# Altium footprint library Angler.PcbLib: 331 footprints (part 8 of 21)
Each footprint in its own frame and in the unit in brackets; x right, y up, seen from the top. Pads: shape width x height; smd on the part's side, far side on the other; paste and mask are expansions set on the pad; w line width, h text height; cw(c..) or ccw(c..) is an arc to the next point about the centre after c.
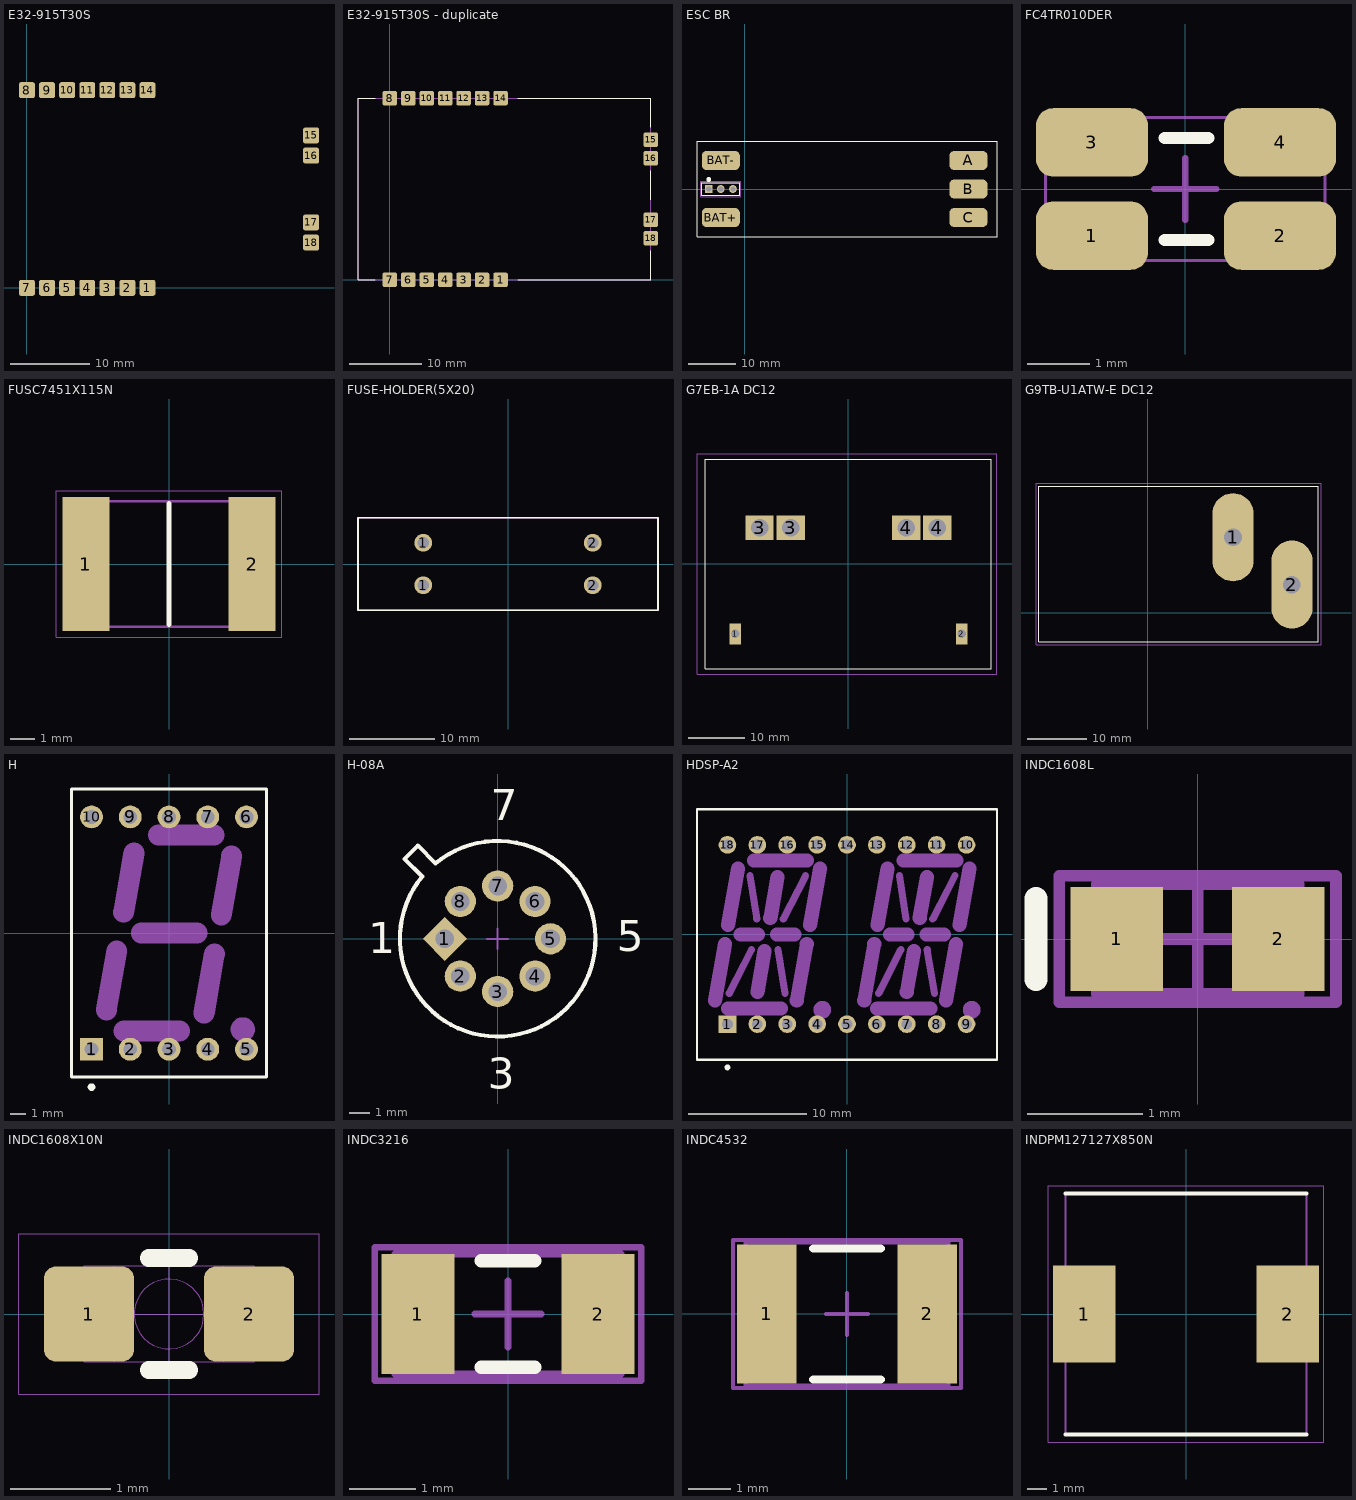
[diagram p7: the footprints below, top view; thin cyan lines are the x and y axes]

## E32-915T30S [mm]
pads (18):
  rrect25% 2x2 smd paste+0 mask+0.064: 1(15.24,0) 2(12.7,0) 3(10.16,0) 4(7.62,0) 5(5.08,0) 6(2.54,0) 7(0,0) 8(0,25) 9(2.54,25) 10(5.08,25) 11(7.62,25) 12(10.16,25) 13(12.7,25) 14(15.24,25) 15(35.92,19.27) 16(35.92,16.73) 17(35.92,8.27) 18(35.92,5.73)

## E32-915T30S - duplicate [mm]
pads (18):
  rrect25% 2x2 smd paste+0 mask+0.064: 1(15.24,0) 2(12.7,0) 3(10.16,0) 4(7.62,0) 5(5.08,0) 6(2.54,0) 7(0,0) 8(0,25) 9(2.54,25) 10(5.08,25) 11(7.62,25) 12(10.16,25) 13(12.7,25) 14(15.24,25) 15(35.92,19.27) 16(35.92,16.73) 17(35.92,8.27) 18(35.92,5.73)
Top Overlay:
  lines w0.152: -2,0 -4.38,0 -4.38,25 -2,25 ; 17.62,0 35.92,0 35.92,4 ; 17.62,25 35.92,25 35.92,21 ; 35.92,11 35.92,15
Mechanical 13:
  lines w0.152: -4.38,0 35.92,0 35.92,25 -4.38,25 -4.38,0

## ESC BR [mm]
pads (8):
  rrect50% 8x4 smd: A(47,6) B(47,0) BAT+(-5,-6) BAT-(-5,6) C(47,-6)
  round 1.65 hole 1.1: GND(-2.46,0) NC(-5,0)
  rect 1.65x1.65 hole 1.1: PWM(-7.54,0)
Top Overlay:
  circle w0.5: c-7.54,2 r0.25
  lines w0.2: -10,-10 53,-10 53,10 -10,10 -10,-10 ; -8.96,-1.345 -8.96,1.345 -1.03,1.345 -1.03,-1.345 -8.96,-1.345
Mechanical 13:
  lines w0.1: -8.96,-1.345 -1.03,-1.345 -1.03,1.345 -8.96,1.345 -8.96,-1.345
Mechanical 15:
  lines w0.05: -9.21,-1.595 -0.79,-1.595 -0.79,1.595 -9.21,1.595 -9.21,-1.595
3D body "Download_STP_61300311121 (rev1).stp": height 8.57, standoff -2.97, extent -8.81,-1.27 -1.19,1.27
3D body "ESC.STEP": height 7.35, standoff 0.07, extent -4.587,-8.6 46.7,8.5

## FC4TR010DER [mm] "1206 WIDE"
height 0.65
pads (4):
  rrect50% 1.8x1.1 smd: 1(-1.5,-0.75) 2(1.525,-0.75) 3(-1.5,0.75) 4(1.525,0.75)
Top Overlay:
  lines w0.2: -0.33,-0.82 0.37,-0.82 ; -0.33,0.82 0.37,0.82
Mechanical 15:
  lines w0.05: -2.25,-1.15 2.25,-1.15 2.25,1.15 -2.25,1.15 -2.25,-1.15
  lines w0.1: -0.5,0 0.5,0 ; 0,-0.5 0,0.5
3D body "RESC3116X06N.step": height 0.65, standoff 0, extent -1.65,-0.875 1.65,0.875

## FUSC7451X115N [mm]
pads (2):
  rect 1.92x5.45 smd: 1(-3.385,0) 2(3.385,0)
Top Overlay:
  lines w0.2: 0,-2.46 0,2.46
Mechanical 13:
  lines w0.1: -3.678,-2.56 -3.678,2.56 3.678,2.56 3.678,-2.56 -3.678,-2.56
Mechanical 15:
  lines w0.05: -4.595,-2.975 -4.595,2.975 4.595,2.975 4.595,-2.975 -4.595,-2.975
3D body "0ZCF0300AF2C.stp": height 1.15, standoff 0, extent -3.678,-2.56 3.678,2.56

## FUSE-HOLDER(5X20) [mm]
pads (4):
  round 2.1 hole 1.4: 1(-10,-2.5) 1(-10,2.5) 2(10,-2.5) 2(10,2.5)
Top Overlay:
  lines w0.2: -17.7,-5.45 17.7,-5.45 17.7,5.45 -17.7,5.45 -17.7,-5.45
Mechanical 13:
  lines w0.2: -17.7,-5.45 -17.7,5.45 17.7,5.45 17.7,-5.45 -17.7,-5.45
3D body "31-8231.stp": height 12.7, standoff -3.13, extent -17.7,-5.45 17.7,5.45
3D body "3AG_MELF.step": height 11.45, standoff 5, extent -16.256,-3.222 16.256,3.222

## G7EB-1A DC12 [mm] "G7EB-1A DC12"
pads (6):
  rect 2x3.7 hole 1.5 square: 1(-20,-12.35) 2(20,-12.35)
  rect 5x4.3 hole 3.1 square: 3(-15.7,6.4) 3(-10.2,6.4) 4(10.2,6.4) 4(15.7,6.4)
Top Overlay:
  lines w0.2: -25.25,-18.5 -25.25,18.5 25.25,18.5 25.25,-18.5 -25.25,-18.5
Mechanical 15:
  lines w0.1: -26.75,-19.5 -26.75,19.5 26.25,19.5 26.25,-19.5 -26.75,-19.5
3D body "g7eb-1a.stp": height 40.5, standoff -4, extent -25.25,-18.5 25.25,18.5

## G9TB-U1ATW-E DC12 [mm] "G9TB-U1ATW-E DC12"
pads (2):
  oval 7x15 hole 3 square: 1(14.5,12.8) 2(24.5,4.75)
Top Overlay:
  lines w0.2: -18.5,-5 -18.5,21.5 29,21.5 29,-5 -18.5,-5
Mechanical 15:
  lines w0.1: -19,-5.5 -19,22 29.5,22 29.5,-5.5 -19,-5.5
3D body "G9TB_U1ATW_E.step": height 38.2, standoff -11.5, extent -20.55,-3 27.15,19.5

## H [mm] "LED, 7-Segment Display, 14.2 mm, RHD; 10 Leads; Row Space 15.24 mm; Pitch 2.54 mm"
height 8.25
pads (10):
  rect 1.5x1.5 hole 0.9: 1(-5.08,-7.62)
  round 1.5 hole 0.9: 2(-2.54,-7.62) 3(0,-7.62) 4(2.54,-7.62) 5(5.08,-7.62) 6(5.08,7.62) 7(2.54,7.62) 8(0,7.62) 9(-2.54,7.62) 10(-5.08,7.62)
Top Overlay:
  circle w0.25: c-5.08,-10.1 r0.125
  lines w0.2: -6.4,-9.45 -6.4,9.45 6.4,9.45 6.4,-9.45 -6.4,-9.45
Mechanical 1:
  circle w1: c4.842,-6.316 r0.296
  lines w1.37: -4.108,-5.054 -3.425,-1.17 ; -2.974,1.368 -2.293,5.255 ; -2.958,-6.429 0.692,-6.426 ; -1.821,0 1.828,0 ; -0.689,6.425 2.96,6.425 ; 2.295,-5.256 2.98,-1.371 ; 3.427,1.169 4.11,5.058
Mechanical 13:
  lines w0.1: -6.4,-9.45 6.4,-9.45 6.4,9.45 -6.4,9.45 -6.4,-9.45
3D body: height 8.25, standoff 0, extent -6.4,-9.45 6.4,9.45

## H-08A [mm] "Can; 8 Leads; Pin Circle Dia. 5.08 mm; Lead Dia. 0.53 mm (max)"
height 4.7
pads (8):
  rect 1.5x1.5 hole 0.9 rot 45: 1(-2.54,0)
  round 1.5 hole 0.9: 2(-1.796,-1.796) 3(0,-2.54) 4(1.796,-1.796) 5(2.54,0) 6(1.796,1.796) 7(0,2.54) 8(-1.796,1.796)
Top Overlay:
  lines w0.2: -4.475,3.838 -3.626,2.99 ccw(c0,0) -2.99,3.626 -3.838,4.475 -4.475,3.838
  text "7" at -0.332,5.7 h1.5
  text "5" at 5.712,-0.589 h1.5
  text "3" at -0.469,-7.22 h1.5
  text "1" at -6.22,-0.696 h1.5
Mechanical 15:
  lines w0.1: -0.5,0 0.5,0 ; 0,-0.5 0,0.5

## HDSP-A2 [mm] "LED, Alphanumeric Display, 13.8 mm, Dual Character; 18 Leads; Row Space 15.24 mm; Pitch 2.54 mm"
height 7.27
pads (18):
  rect 1.5x1.5 hole 0.9: 1(-10.16,-7.62)
  round 1.5 hole 0.9: 2(-7.62,-7.62) 3(-5.08,-7.62) 4(-2.54,-7.62) 5(0,-7.62) 6(2.54,-7.62) 7(5.08,-7.62) 8(7.62,-7.62) 9(10.16,-7.62) 10(10.16,7.62) 11(7.62,7.62) 12(5.08,7.62) 13(2.54,7.62) 14(0,7.62) 15(-2.54,7.62) 16(-5.08,7.62) 17(-7.62,7.62) 18(-10.16,7.62)
Top Overlay:
  circle w0.25: c-10.16,-11.3 r0.125
  lines w0.2: -12.75,-10.65 12.75,-10.65 12.75,10.65 -12.75,10.65 -12.75,-10.65
Mechanical 1:
  circle w1.2: c-2.1,-6.4 r0.15
  circle w1.2: c10.6,-6.4 r0.15
  lines w0.6: -10.01,-5 -8.12,-1.3 ; -8.25,5 -7.67,1.3 ; -5.88,-1.3 -5.28,-5 ; -5.42,1.3 -3.52,5 ; 2.69,-5 4.58,-1.3 ; 4.45,5 5.03,1.3 ; 6.82,-1.3 7.42,-5 ; 7.28,1.3 9.18,5
  lines w1.2: -11.23,-5.6 -10.38,-0.8 ; -10.13,-6.3 -5.62,-6.3 ; -10.1,0.8 -9.26,5.58 ; -9.035,0 -7.58,0 ; -7.9,6.3 -3.39,6.3 ; -7.62,-4.89 -7.01,-1.4 ; -6.52,1.41 -5.91,4.89 ; -5.96,0 -4.465,0 ; -4.27,-5.6 -3.42,-0.8 ; -3.13,0.81 -2.3,5.59 ; 1.47,-5.6 2.32,-0.8 ; 2.57,-6.3 7.08,-6.3 ; 2.6,0.8 3.44,5.58 ; 3.665,0 5.14,0 ; 4.8,6.3 9.31,6.3 ; 5.08,-4.89 5.69,-1.4 ; 6.18,1.41 6.79,4.89 ; 6.76,0 8.235,0 ; 8.43,-5.6 9.28,-0.8 ; 9.57,0.81 10.4,5.59
Mechanical 13:
  lines w0.1: -12.75,-10.65 -12.75,10.65 12.75,10.65 12.75,-10.65 -12.75,-10.65
3D body: height 7.27, standoff 0, extent -12.75,-10.65 12.75,10.65

## INDC1608L [mm] "Chip Inductor, Body 1.6x0.8mm, IPC High Density"
height 0.55
pads (2):
  rect 0.8x0.9 smd: 1(-0.7,0) 2(0.7,0)
Top Overlay:
  lines w0.2: -1.4,-0.35 -1.4,0.35
Mechanical 13:
  lines w0.1: -0.875,-0.475 -0.875,0.475 0.875,0.475 0.875,-0.475 -0.875,-0.475
Mechanical 15:
  lines w0.1: -0.475,0 0.475,0 ; 0,-0.475 0,0.475 ; -1.2,-0.55 -1.2,0.55 1.2,0.55 1.2,-0.55 -1.2,-0.55
3D body: height 0.55, standoff 0, extent -0.875,-0.475 0.875,0.475

## INDC1608X10N [mm] "0603, Body 1.5x0.8x1.0mm, IPC Medium Density"
height 1
pads (2):
  rrect25% 0.9x0.95 smd paste+0 mask+0.064: 1(-0.8,0) 2(0.8,0)
Top Overlay:
  lines w0.178: -0.203,-0.559 0.203,-0.559 ; -0.203,0.559 0.203,0.559
Mechanical 9:
  lines w0.01: -0.55,-0.48 -0.55,0.475 ; 0.55,-0.48 0.55,0.475 ; -0.85,-0.48 0.85,-0.48 0.85,0.48 -0.85,0.48 -0.85,-0.48
Mechanical 11:
  text ".Designator" at -0.9,-0.3 h1
Mechanical 15:
  circle w0.01: c0,0 r0.35
  lines w0.01: -0.5,0 0.5,0 ; 0,-0.5 0,0.5 ; -1.5,-0.8 -1.5,0.8 1.5,0.8 1.5,-0.8 -1.5,-0.8
3D body "INDC1608X10N.step": height 0.95, standoff 0, extent -0.875,-0.475 0.875,0.475

## INDC3216 [mm] "Chip Inductor, Body 3.2x1.6mm, IPC High Density"
height 0.55
pads (2):
  rect 1.1x1.8 smd: 1(-1.35,0) 2(1.35,0)
Top Overlay:
  lines w0.2: -0.4,-0.8 0.4,-0.8 ; -0.4,0.8 0.4,0.8
Mechanical 13:
  lines w0.1: -1.7,-0.9 -1.7,0.9 1.7,0.9 1.7,-0.9 -1.7,-0.9
Mechanical 15:
  lines w0.1: -0.5,0 0.5,0 ; 0,-0.5 0,0.5 ; -2,-1 -2,1 2,1 2,-1 -2,-1
3D body: height 0.55, standoff 0, extent -1.7,-0.9 1.7,0.9

## INDC4532 [mm] "Chip Inductor, Body 4.5x3.2mm, IPC High Density"
height 0.55
pads (2):
  rect 1.4x3.3 smd: 1(-1.9,0) 2(1.9,0)
Top Overlay:
  lines w0.2: -0.8,-1.55 0.8,-1.55 ; -0.8,1.55 0.8,1.55
Mechanical 13:
  lines w0.1: -2.4,-1.7 2.4,-1.7 2.4,1.7 -2.4,1.7 -2.4,-1.7
Mechanical 15:
  lines w0.1: -0.5,0 0.5,0 ; 0,-0.5 0,0.5 ; -2.7,-1.75 2.7,-1.75 2.7,1.75 -2.7,1.75 -2.7,-1.75
3D body: height 0.55, standoff 0, extent -2.4,-1.7 2.4,1.7

## INDPM127127X850N [mm]
pads (2):
  rect 3.3x5.1 smd: 1(-5.35,0) 2(5.35,0)
Top Overlay:
  lines w0.2: -6.35,-6.35 6.35,-6.35 ; -6.35,6.35 6.35,6.35
Mechanical 13:
  lines w0.1: -6.35,-6.35 6.35,-6.35 6.35,6.35 -6.35,6.35 -6.35,-6.35
Mechanical 15:
  lines w0.05: -7.25,-6.75 7.25,-6.75 7.25,6.75 -7.25,6.75 -7.25,-6.75
3D body "SRR1208-6R5ML.stp": height 8.5, standoff 0, extent -6.35,-6.35 6.35,6.35